# Altium footprint library MercurialSDR.PcbLib: 87 footprints (part 1 of 6)
Each footprint in its own frame and in the unit in brackets; x right, y up, seen from the top. Pads: shape width x height; smd on the part's side, far side on the other; paste and mask are expansions set on the pad; w line width, h text height; cw(c..) or ccw(c..) is an arc to the next point about the centre after c.
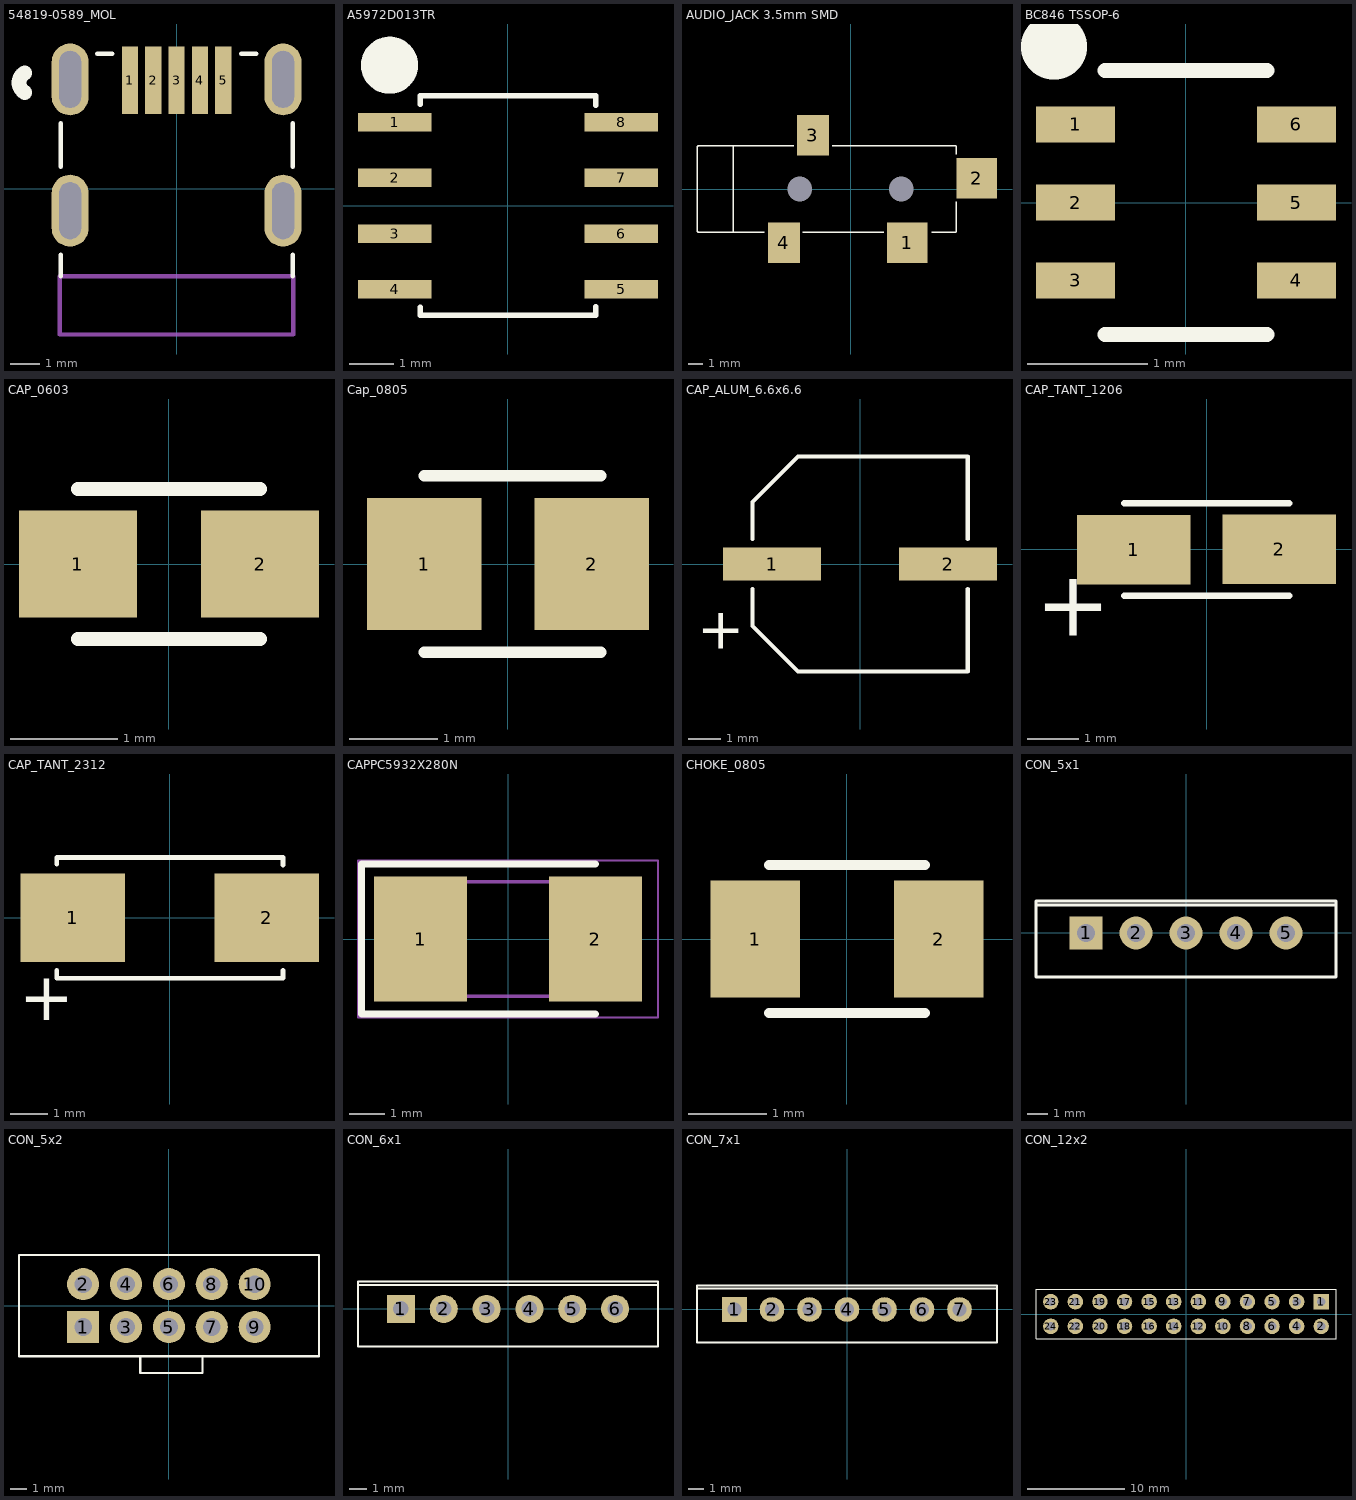
[diagram p0: the footprints below, top view; thin cyan lines are the x and y axes]

## 54819-0589_MOL [mil]
pads (9):
  rect 22x91 smd paste+0 mask+0: 1(-62.99,146.49) 2(-31.5,146.49) 3(0,146.49) 4(31.5,146.49) 5(62.99,146.49)
  oval 50x97 hole 29.53 slot 76.77 at 90 deg mask+0: ""(-143.7,-29.69) ""(-143.7,147.47) ""(143.7,-29.69) ""(143.7,147.47)
Top Overlay:
  lines w6: -156.5,-118.11 -156.5,-89.08 ; -156.5,29.69 -156.5,88.09 ; -107.23,182 -87.09,182 ; 87.09,182 107.23,182 ; 156.5,-118.11 156.5,-89.08 ; 156.5,29.69 156.5,88.09
  lines w20: -205,130 cw(c-197.7,143.1) -205,156.21
Mechanical 15:
  lines w6: 78.74,-196.85 157.48,-196.85 ; 137.8,-196.85 -157.48,-196.85 -157.48,-118.11 157.48,-118.11 157.48,-177.17 157.48,-196.85 ; 143.7,-196.85 157.48,-196.85
Multi-Layer:
  lines w30: -143.7,-53.19 -143.7,-6.19 ; -143.7,123.97 -143.7,170.97 ; 143.7,-53.19 143.7,-6.19 ; 143.7,123.97 143.7,170.97
3D body "548190589.stp": height 179.13, standoff -51.18, extent -151.57,-177.16 151.57,177.16

## A5972D013TR [mm] "Switching Regulator"
pads (8):
  rect 1.67x0.42 smd: 1(-2.582,1.905) 2(-2.582,0.635) 3(-2.582,-0.635) 4(-2.582,-1.905) 5(2.583,-1.905) 6(2.583,-0.635) 7(2.583,0.635) 8(2.583,1.905)
Top Overlay:
  circle w0.7: c-2.7,3.2 r0.3
  lines w0.127: -2,-2.31 -2,-2.5 2,-2.5 2,-2.3 ; -2,2.31 -2,2.5 2,2.5 2,2.29
3D body "User Library-A5972D013TR-so8.STEP": height 1.45, standoff 0, extent -2.903,-2.448 2.876,2.454

## AUDIO_JACK 3.5mm SMD [mm] "SJ-3524-SMT"
pads (6):
  rect 2.8x2.8 smd: 1(3.9,-3.7) 2(8.7,0.75)
  rect 2.2x2.8 smd: 3(-2.6,3.7) 4(-4.6,-3.7)
  round 0 hole 1.7: ""(-3.5,0) ""(3.5,0)
Top Overlay:
  lines w0.1: -8.1,2.921 -8.1,-3 ; -5.969,-3 -8.1,-3 ; -3.937,3 -8.1,3 -10.521,3 -10.6,2.921 -10.6,-2.921 -10.521,-3 -8.1,-3 ; -3.302,-3 2.286,-3 ; -1.27,3 7.239,3 ; 5.588,-3 7.239,-3 ; 7.3,-3 7.3,-0.889 ; 7.3,2.413 7.3,3
3D body "User Library-35RASMT4BHNTRX.step": height 5.3, standoff -0.7, extent -9.6,-4.5 9.4,4.5

## BC846 TSSOP-6 [mm] "Array TBJ x2 TSSOP-6"
pads (6):
  rect 0.66x0.3 smd: 1(-0.92,0.65) 2(-0.92,0) 3(-0.92,-0.65) 4(0.92,-0.65) 5(0.92,0) 6(0.92,0.65)
Top Overlay:
  circle w0.5: c-1.1,1.3 r0.025
  lines w0.127: -0.675,-1.1 0.675,-1.1 ; -0.675,1.1 0.675,1.1
3D body "User Library-TSSOP-6 (SOT-23-6 PITCH 0_65).STEP": height 1.1, standoff -0.01, extent -1.145,-1.125 1.105,1.125

## CAP_0603 [mm] "Capacitor SMD 0603"
pads (2):
  rect 1.1x1 smd: 1(-0.85,0) 2(0.85,0)
Top Overlay:
  lines w0.127: -0.85,-0.7 0.85,-0.7 ; -0.85,0.7 0.85,0.7
3D body "User Library-0603 SMD Capacitor.step": height 0.8, standoff 0, extent -1.23,-0.4 1.23,0.4

## Cap_0805 [mm] "Capacitor SMD 0805"
pads (2):
  rect 1.3x1.5 smd: 1(-0.95,0) 2(0.95,0)
Top Overlay:
  lines w0.127: -0.95,-1 1.05,-1 ; -0.95,1 1.05,1
3D body "User Library-0805 SMD Capacitor_3.step": height 0.8, standoff 0, extent -1,-0.625 1,0.625

## CAP_ALUM_6.6x6.6 [mm] "Aluminum Electrolytic Capacitor, 47uF, 50V"
height 7.8
pads (2):
  rect 3x1 smd: 1(-2.7,0) 2(2.7,0)
Top Overlay:
  lines w0.127: -3.3,-0.762 -3.3,-1.9 -1.9,-3.3 -1.526,-3.3 3.302,-3.3 3.302,-0.762 ; -3.3,0.762 -3.3,1.526 -3.3,1.9 -1.9,3.3 -1.526,3.3 3.302,3.3 3.302,0.762
  text "+" at -5,-2.6 h1.27
3D body "User Library-capacitor size D.step": height 5.41, standoff -0.01, extent -3.5,-3.3 3.5,3.3

## CAP_TANT_1206 [mm] "Capacitor Tantalio 1206"
pads (2):
  rect 2.2x1.35 smd: 1(-1.41,-0.005) 2(1.41,0.005)
Top Overlay:
  lines w0.127: -1.6,-0.9 1.6,-0.9 ; -1.6,0.9 1.6,0.9
  text "+" at -3.31,-1.67 h1.27
3D body "User Library-CAP_TAN_C3216_1206.step": height 1.8, standoff 0, extent -1.73,-0.905 1.67,0.895

## CAP_TANT_2312 [mm] "Capacitor de tantalio 2312"
pads (2):
  rect 2.77x2.35 smd: 1(-2.57,0) 2(2.57,0)
Top Overlay:
  lines w0.127: -3,-1.39 -3,-1.6 3,-1.6 3,-1.39 ; -3,1.42 -3,1.6 3,1.6 3,1.4
  text "+" at -4,-2.72 h1.27
3D body "User Library-Tantalum_capacitor_AVX_C_CASE.step": height 2.7, standoff 0, extent -3.04,-1.655 3.06,1.695

## CAPPC5932X280N [mm]
pads (2):
  rect 2.6x3.5 smd: 1(-2.45,0) 2(2.45,0)
Top Overlay:
  lines w0.2: 2.45,-2.1 -4.1,-2.1 -4.1,2.1 2.45,2.1
Mechanical 13:
  lines w0.1: -2.95,0.3 -1.65,1.6 ; -2.95,-1.6 2.95,-1.6 2.95,1.6 -2.95,1.6 -2.95,-1.6
Mechanical 15:
  lines w0.05: -4.2,-2.2 4.2,-2.2 4.2,2.2 -4.2,2.2 -4.2,-2.2
3D body "595D476X9016C2T.stp": height 2.8, standoff 0, extent -2.95,-1.6 2.95,1.6

## CHOKE_0805 [mm] "Choke 0805"
pads (2):
  rect 1.15x1.5 smd: 1(-1.175,0) 2(1.175,0)
Top Overlay:
  lines w0.127: -1,-0.95 1,-0.95 ; -1,0.95 1,0.95

## CON_5x1 [mm] "Conector 5x1"
pads (5):
  rect 1.64x1.64 hole 0.91: 1(-5,0)
  round 1.64 hole 0.91: 2(-2.5,0) 3(0,0) 4(2.5,0) 5(5,0)
Top Overlay:
  lines w0.127: -7.5,1.4 7.5,1.4 ; -7.5,-2.2 7.5,-2.2 7.5,1.6 7.4,1.6 -7.5,1.6 -7.5,-2.2
3D body "User Library-conn5x1.STEP": height 7.1, standoff -3.1, extent -7.5,-3.2 7.5,2.6

## CON_5x2 [mm] "Conector 5x2"
pads (10):
  rect 1.9x1.9 hole 1.05: 1(-5.08,-1.27)
  round 1.9 hole 1.05: 2(-5.08,1.27) 3(-2.54,-1.27) 4(-2.54,1.27) 5(0,-1.27) 6(0,1.27) 7(2.54,-1.27) 8(2.54,1.27)
  round 1.9 hole 1.05 unplated: 9(5.08,-1.27) 10(5.08,1.27)
Top Overlay:
  lines w0.127: -1.7,-3.1 -1.7,-4 2,-4 2,-3 ; -8.878,-3 8.89,-3 8.89,3 -8.878,3 -8.878,-3
3D body "User Library-Header 5X2.STEP": height 9.93, standoff -1.77, extent -6.6,-2.48 6.6,2.6

## CON_6x1 [mm] "Conector 6x1"
pads (6):
  rect 1.64x1.64 hole 0.91: 1(-6.25,0)
  round 1.64 hole 0.91: 2(-3.75,0) 3(-1.25,0) 4(1.25,0) 5(3.75,0) 6(6.25,0)
Top Overlay:
  lines w0.127: -8.75,1.4 8.75,1.4 ; -8.75,-2.2 -8.75,1.6 8.75,1.6 8.75,-2.2 -8.75,-2.2
3D body "User Library-conn6x1.STEP": height 7.1, standoff -3.1, extent -8.75,-3.15 8.75,2.65

## CON_7x1 [mm] "Conector 7x1"
pads (7):
  rect 1.64x1.64 hole 0.91: 1(-7.5,0)
  round 1.64 hole 0.91: 2(-5,0) 3(-2.5,0) 4(0,0) 5(2.5,0) 6(5,0) 7(7.5,0)
Top Overlay:
  lines w0.127: -10,1.4 10,1.4 ; -10,-2.2 10,-2.2 10,1.6 -10,1.6 -10,-2.2
3D body "User Library-conn7x1.STEP": height 7.1, standoff -3.1, extent -10.05,-3.2 9.95,2.6

## CON_12x2 [mil] "Conector 12x2"
pads (24):
  rect 63x63 hole 35: 1(550,50)
  round 63 hole 35: 2(550,-50) 3(450,50) 4(450,-50) 5(350,50) 6(350,-50) 7(250,50) 8(250,-50) 9(150,50) 10(150,-50) 11(50,50) 12(50,-50) 13(-50,50) 14(-50,-50) 15(-150,50) 16(-150,-50) 17(-250,50) 18(-250,-50) 19(-350,50) 20(-350,-50) 21(-450,50) 22(-450,-50) 23(-550,50) 24(-550,-50)
Top Overlay:
  lines w5: -610,-100 -610,100 610,100 610,-100 -610,-100
3D body "User Library-conn12x2.STEP": height 354.33, standoff -98.43, extent -607.87,-99.21 607.88,99.22